# Altium footprint library IC.PCBLIB: 359 footprints (part 20 of 23)
Each footprint in its own frame and in the unit in brackets; x right, y up, seen from the top. Pads: shape width x height; smd on the part's side, far side on the other; paste and mask are expansions set on the pad; w line width, h text height; cw(c..) or ccw(c..) is an arc to the next point about the centre after c.
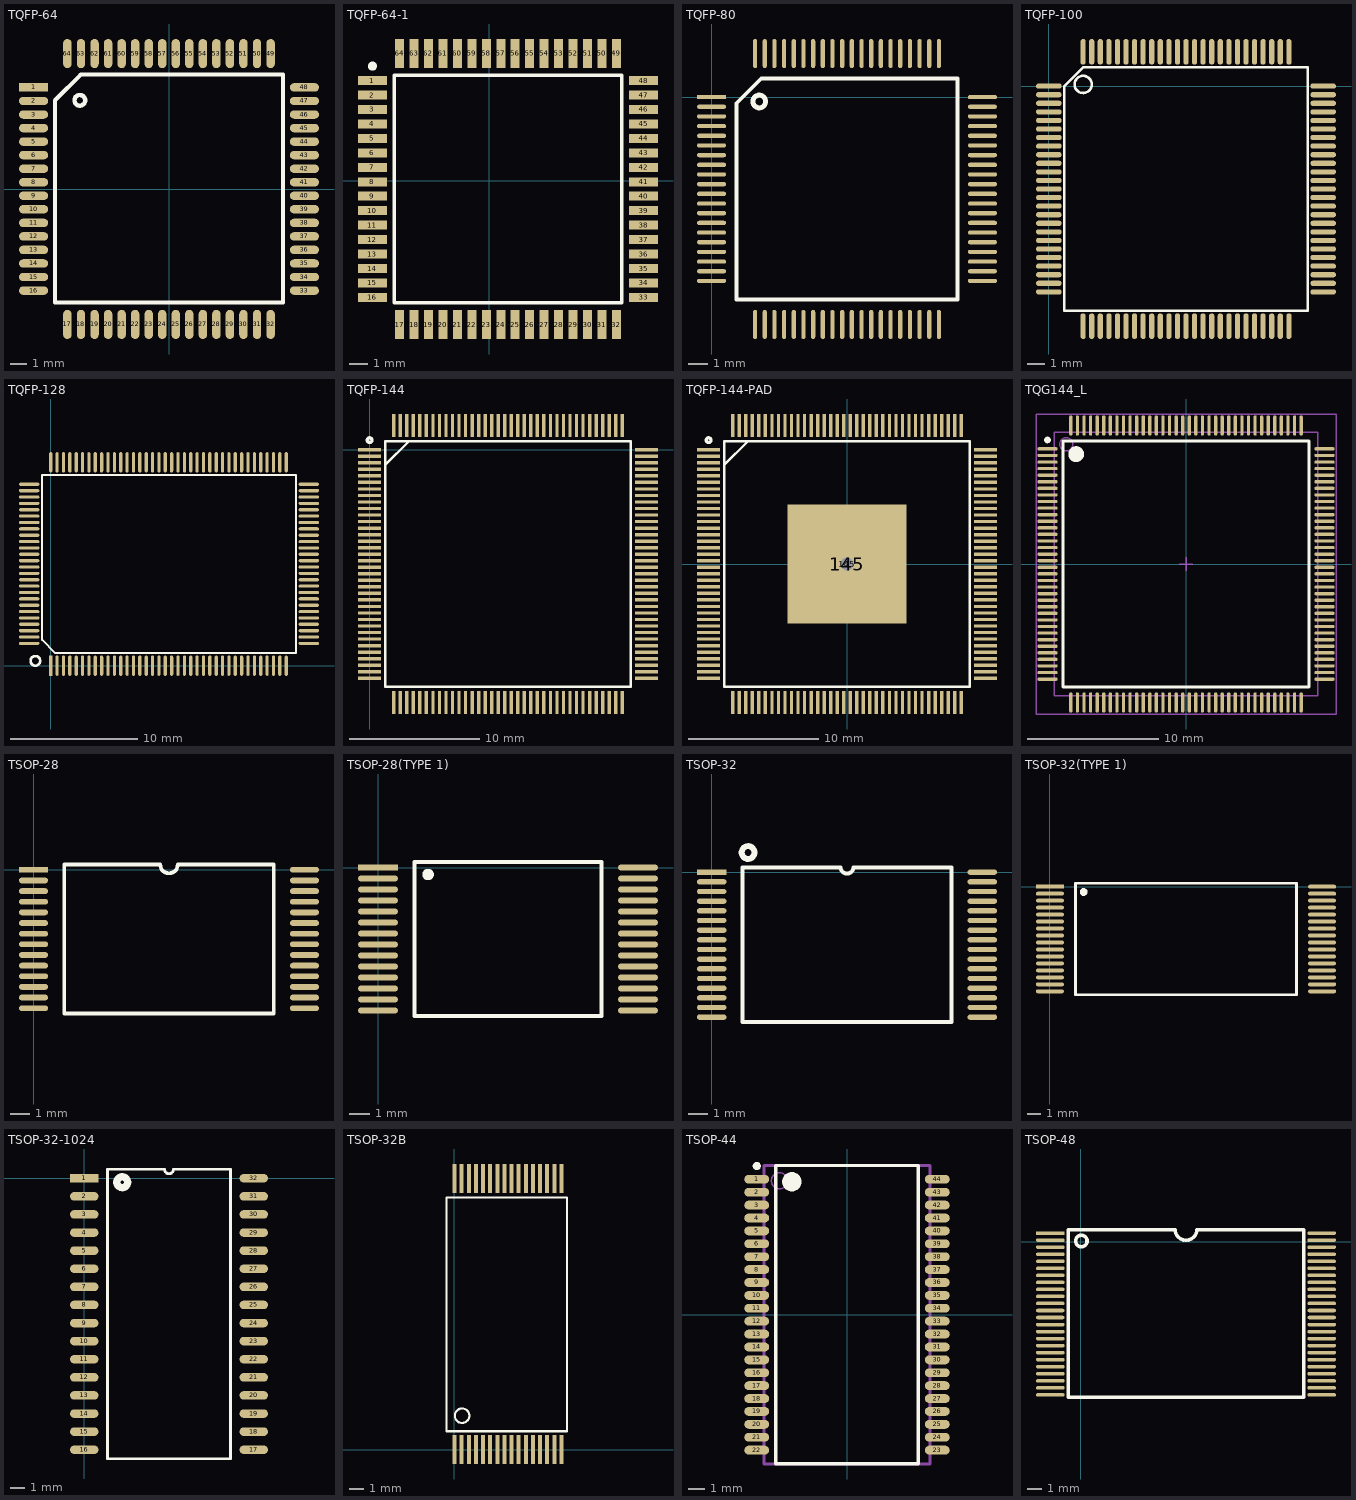
[diagram p19: the footprints below, top view; thin cyan lines are the x and y axes]

## TQFP-64 [mm]
pads (64):
  rect 1.724x0.5 smd: 1(-8,6)
  oval 1.724x0.5 smd: 2(-8,5.2) 3(-8,4.4) 4(-8,3.6) 5(-8,2.8) 6(-8,2) 7(-8,1.2) 8(-8,0.4) 9(-8,-0.4) 10(-8,-1.2) 11(-8,-2) 12(-8,-2.8) 13(-8,-3.6) 14(-8,-4.4) 15(-8,-5.2) 16(-8,-6) 33(8,-6) 34(8,-5.2) 35(8,-4.4) 36(8,-3.6) 37(8,-2.8) 38(8,-2) 39(8,-1.2) 40(8,-0.4) 41(8,0.4) 42(8,1.2) 43(8,2) 44(8,2.8) 45(8,3.6) 46(8,4.4) 47(8,5.2) 48(8,6)
  oval 0.5x1.724 smd: 17(-6,-8) 18(-5.2,-8) 19(-4.4,-8) 20(-3.6,-8) 21(-2.8,-8) 22(-2,-8) 23(-1.2,-8) 24(-0.4,-8) 25(0.4,-8) 26(1.2,-8) 27(2,-8) 28(2.8,-8) 29(3.6,-8) 30(4.4,-8) 31(5.2,-8) 32(6,-8) 49(6,8) 50(5.2,8) 51(4.4,8) 52(3.6,8) 53(2.8,8) 54(2,8) 55(1.2,8) 56(0.4,8) 57(-0.4,8) 58(-1.2,8) 59(-2,8) 60(-2.8,8) 61(-3.6,8) 62(-4.4,8) 63(-5.2,8) 64(-6,8)
TopOverlay:
  circle w0.254: c-5.268,5.238 r0.316
  lines w0.254: -6.73,-6.7 -6.73,5.238 -5.206,6.762 6.732,6.762 6.732,-6.7 -6.73,-6.7

## TQFP-64-1 [mm]
pads (64):
  rect 1.6x0.5 smd: 1(-6.459,5.543) 2(-6.459,4.743) 3(-6.459,3.943) 4(-6.459,3.143) 5(-6.459,2.343) 6(-6.459,1.543) 7(-6.459,0.743) 8(-6.459,-0.057) 9(-6.459,-0.857) 10(-6.459,-1.657) 11(-6.459,-2.457) 12(-6.459,-3.257) 13(-6.459,-4.057) 14(-6.459,-4.857) 15(-6.459,-5.657) 16(-6.459,-6.457) 33(8.541,-6.457) 34(8.541,-5.657) 35(8.541,-4.857) 36(8.541,-4.057) 37(8.541,-3.257) 38(8.541,-2.457) 39(8.541,-1.657) 40(8.541,-0.857) 41(8.541,-0.057) 42(8.541,0.743) 43(8.541,1.543) 44(8.541,2.343) 45(8.541,3.143) 46(8.541,3.943) 47(8.541,4.743) 48(8.541,5.543)
  rect 0.5x1.6 smd: 17(-4.959,-7.957) 18(-4.159,-7.957) 19(-3.359,-7.957) 20(-2.559,-7.957) 21(-1.759,-7.957) 22(-0.959,-7.957) 23(-0.159,-7.957) 24(0.641,-7.957) 25(1.441,-7.957) 26(2.241,-7.957) 27(3.041,-7.957) 28(3.841,-7.957) 29(4.641,-7.957) 30(5.441,-7.957) 31(6.241,-7.957) 32(7.041,-7.957) 49(7.041,7.043) 50(6.241,7.043) 51(5.441,7.043) 52(4.641,7.043) 53(3.841,7.043) 54(3.041,7.043) 55(2.241,7.043) 56(1.441,7.043) 57(0.641,7.043) 58(-0.159,7.043) 59(-0.959,7.043) 60(-1.759,7.043) 61(-2.559,7.043) 62(-3.359,7.043) 63(-4.159,7.043) 64(-4.959,7.043)
TopOverlay:
  circle w0.25: c-6.459,6.343 r0.125
  lines w0.2: -5.259,-6.757 -5.259,5.843 7.341,5.843 7.341,-6.757 -5.259,-6.757

## TQFP-80 [mm]
pads (80):
  rect 1.5x0.22 smd: 1(0,0)
  oval 1.5x0.22 smd: 2(0,-0.5) 3(0,-1) 4(0,-1.5) 5(0,-2) 6(0,-2.5) 7(0,-3) 8(0,-3.5) 9(0,-4) 10(0,-4.5) 11(0,-5) 12(0,-5.5) 13(0,-6) 14(0,-6.5) 15(0,-7) 16(0,-7.5) 17(0,-8) 18(0,-8.5) 19(0,-9) 20(0,-9.5) 41(14,-9.5) 42(14,-9) 43(14,-8.5) 44(14,-8) 45(14,-7.5) 46(14,-7) 47(14,-6.5) 48(14,-6) 49(14,-5.5) 50(14,-5) 51(14,-4.5) 52(14,-4) 53(14,-3.5) 54(14,-3) 55(14,-2.5) 56(14,-2) 57(14,-1.5) 58(14,-1) 59(14,-0.5) 60(14,0)
  oval 0.22x1.5 smd: 21(2.25,-11.75) 22(2.75,-11.75) 23(3.25,-11.75) 24(3.75,-11.75) 25(4.25,-11.75) 26(4.75,-11.75) 27(5.25,-11.75) 28(5.75,-11.75) 29(6.25,-11.75) 30(6.75,-11.75) 31(7.25,-11.75) 32(7.75,-11.75) 33(8.25,-11.75) 34(8.75,-11.75) 35(9.25,-11.75) 36(9.75,-11.75) 37(10.25,-11.75) 38(10.75,-11.75) 39(11.25,-11.75) 40(11.75,-11.75) 61(11.75,2.25) 62(11.25,2.25) 63(10.75,2.25) 64(10.25,2.25) 65(9.75,2.25) 66(9.25,2.25) 67(8.75,2.25) 68(8.25,2.25) 69(7.75,2.25) 70(7.25,2.25) 71(6.75,2.25) 72(6.25,2.25) 73(5.75,2.25) 74(5.25,2.25) 75(4.75,2.25) 76(4.25,2.25) 77(3.75,2.25) 78(3.25,2.25) 79(2.75,2.25) 80(2.25,2.25)
TopOverlay:
  circle w0.254: c2.465,-0.229 r0.329
  lines w0.2: 1.285,-10.465 12.715,-10.465 12.715,0.965 2.57,0.965 1.285,-0.32 1.285,-10.465

## TQFP-100 [mm]
pads (100):
  oval 1.5x0.3 smd: 1(0,0) 2(0,-0.5) 3(0,-1) 4(0,-1.5) 5(0,-2) 6(0,-2.5) 7(0,-3) 8(0,-3.5) 9(0,-4) 10(0,-4.5) 11(0,-5) 12(0,-5.5) 13(0,-6) 14(0,-6.5) 15(0,-7) 16(0,-7.5) 17(0,-8) 18(0,-8.5) 19(0,-9) 20(0,-9.5) 21(0,-10) 22(0,-10.5) 23(0,-11) 24(0,-11.5) 25(0,-12) 51(16,-12) 52(16,-11.5) 53(16,-11) 54(16,-10.5) 55(16,-10) 56(16,-9.5) 57(16,-9) 58(16,-8.5) 59(16,-8) 60(16,-7.5) 61(16,-7) 62(16,-6.5) 63(16,-6) 64(16,-5.5) 65(16,-5) 66(16,-4.5) 67(16,-4) 68(16,-3.5) 69(16,-3) 70(16,-2.5) 71(16,-2) 72(16,-1.5) 73(16,-1) 74(16,-0.5) 75(16,0)
  oval 0.3x1.5 smd: 26(2,-14) 27(2.5,-14) 28(3,-14) 29(3.5,-14) 30(4,-14) 31(4.5,-14) 32(5,-14) 33(5.5,-14) 34(6,-14) 35(6.5,-14) 36(7,-14) 37(7.5,-14) 38(8,-14) 39(8.5,-14) 40(9,-14) 41(9.5,-14) 42(10,-14) 43(10.5,-14) 44(11,-14) 45(11.5,-14) 46(12,-14) 47(12.5,-14) 48(13,-14) 49(13.5,-14) 50(14,-14) 76(14,2) 77(13.5,2) 78(13,2) 79(12.5,2) 80(12,2) 81(11.5,2) 82(11,2) 83(10.5,2) 84(10,2) 85(9.5,2) 86(9,2) 87(8.5,2) 88(8,2) 89(7.5,2) 90(7,2) 91(6.5,2) 92(6,2) 93(5.5,2) 94(5,2) 95(4.5,2) 96(4,2) 97(3.5,2) 98(3,2) 99(2.5,2) 100(2,2)
TopOverlay:
  circle w0.152: c2,0.1 r0.5
  lines w0.152: 0.9,-13.1 15.1,-13.1 15.1,1.1 2,1.1 0.9,0 0.9,-13.1

## TQFP-128 [mil]
pads (128):
  rect 10x62.99 smd: 1(0,0)
  oval 10x62.99 smd: 2(19.68,0) 3(39.37,0) 4(59.05,0) 5(78.74,0) 6(98.42,0) 7(118.11,0) 8(137.79,0) 9(157.48,0) 10(177.16,0) 11(196.85,0) 12(216.53,0) 13(236.22,0) 14(255.91,0) 15(275.59,0) 16(295.27,0) 17(314.96,0) 18(334.64,0) 19(354.33,0) 20(374.01,0) 21(393.7,0) 22(413.38,0) 23(433.07,0) 24(452.75,0) 25(472.44,0) 26(492.12,0) 27(511.81,0) 28(531.5,0) 29(551.18,0) 30(570.87,0) 31(590.55,0) 32(610.24,0) 33(629.92,0) 34(649.61,0) 35(669.29,0) 36(688.98,0) 37(708.66,0) 38(728.35,0) 65(728.35,629) 66(708.66,629) 67(688.98,629) 68(669.29,629) 69(649.61,629) 70(629.92,629) 71(610.24,629) 72(590.55,629) 73(570.87,629) 74(551.18,629) 75(531.5,629) 76(511.81,629) 77(492.12,629) 78(472.44,629) 79(452.75,629) 80(433.07,629) 81(413.38,629) 82(393.7,629) 83(374.01,629) 84(354.33,629) 85(334.64,629) 86(314.96,629) 87(295.27,629) 88(275.59,629) 89(255.91,629) 90(236.22,629) 91(216.53,629) 92(196.85,629) 93(177.16,629) 94(157.48,629) 95(137.79,629) 96(118.11,629) 97(98.42,629) 98(78.74,629) 99(59.05,629) 100(39.37,629) 101(19.68,629) 102(0,629)
  oval 62.99x10 smd: 39(798.35,68.88) 40(798.35,88.56) 41(798.35,108.25) 42(798.35,127.93) 43(798.35,147.62) 44(798.35,167.3) 45(798.35,186.99) 46(798.35,206.67) 47(798.35,226.35) 48(798.35,246.04) 49(798.35,265.73) 50(798.35,285.41) 51(798.35,305.1) 52(798.35,324.78) 53(798.35,344.46) 54(798.35,364.15) 55(798.35,383.83) 56(798.35,403.52) 57(798.35,423.2) 58(798.35,442.89) 59(798.35,462.57) 60(798.35,482.26) 61(798.35,501.94) 62(798.35,521.63) 63(798.35,541.32) 64(798.35,561) 103(-66.66,561) 104(-66.66,541.32) 105(-66.66,521.63) 106(-66.66,501.94) 107(-66.66,482.26) 108(-66.66,462.57) 109(-66.66,442.89) 110(-66.66,423.2) 111(-66.66,403.52) 112(-66.66,383.83) 113(-66.66,364.15) 114(-66.66,344.46) 115(-66.66,324.78) 116(-66.66,305.1) 117(-66.66,285.41) 118(-66.66,265.73) 119(-66.66,246.04) 120(-66.66,226.35) 121(-66.66,206.67) 122(-66.66,186.99) 123(-66.66,167.3) 124(-66.66,147.62) 125(-66.66,127.93) 126(-66.66,108.25) 127(-66.66,88.56) 128(-66.66,68.88)
TopOverlay:
  circle w8: c-47.52,14.88 r14.87
  lines w6: -26.66,79.88 14.35,38.88 759.35,38.88 759.35,589.88 -26.66,589.88 -26.66,79.88

## TQFP-144 [mil]
pads (144):
  rect 70x10 smd: 1(0,0) 2(0,-19.68) 3(0,-39.37) 4(0,-59.05) 5(0,-78.74) 6(0,-98.42) 7(0,-118.11) 8(0,-137.79) 9(0,-157.48) 10(0,-177.16) 11(0,-196.85) 12(0,-216.53) 13(0,-236.22) 14(0,-255.91) 15(0,-275.59) 16(0,-295.28) 17(0,-314.96) 18(0,-334.65) 19(0,-354.33) 20(0,-374.02) 21(0,-393.7) 22(0,-413.39) 23(0,-433.07) 24(0,-452.76) 25(0,-472.44) 26(0,-492.13) 27(0,-511.81) 28(0,-531.5) 29(0,-551.18) 30(0,-570.87) 31(0,-590.55) 32(0,-610.24) 33(0,-629.92) 34(0,-649.61) 35(0,-669.29) 36(0,-688.98) 73(834.65,-688.98) 74(834.65,-669.29) 75(834.65,-649.61) 76(834.65,-629.92) 77(834.65,-610.24) 78(834.65,-590.55) 79(834.65,-570.87) 80(834.65,-551.18) 81(834.65,-531.5) 82(834.65,-511.81) 83(834.65,-492.13) 84(834.65,-472.44) 85(834.65,-452.76) 86(834.65,-433.07) 87(834.65,-413.39) 88(834.65,-393.7) 89(834.65,-374.02) 90(834.65,-354.33) 91(834.65,-334.65) 92(834.65,-314.96) 93(834.65,-295.28) 94(834.65,-275.59) 95(834.65,-255.91) 96(834.65,-236.22) 97(834.65,-216.53) 98(834.65,-196.85) 99(834.65,-177.16) 100(834.65,-157.48) 101(834.65,-137.79) 102(834.65,-118.11) 103(834.65,-98.42) 104(834.65,-78.74) 105(834.65,-59.05) 106(834.65,-39.37) 107(834.65,-19.68) 108(834.65,0)
  rect 10x70 smd: 37(72.83,-761.81) 38(92.52,-761.81) 39(112.2,-761.81) 40(131.89,-761.81) 41(151.57,-761.81) 42(171.26,-761.81) 43(190.94,-761.81) 44(210.63,-761.81) 45(230.31,-761.81) 46(250,-761.81) 47(269.69,-761.81) 48(289.37,-761.81) 49(309.06,-761.81) 50(328.74,-761.81) 51(348.43,-761.81) 52(368.11,-761.81) 53(387.8,-761.81) 54(407.48,-761.81) 55(427.17,-761.81) 56(446.85,-761.81) 57(466.54,-761.81) 58(486.22,-761.81) 59(505.91,-761.81) 60(525.59,-761.81) 61(545.28,-761.81) 62(564.96,-761.81) 63(584.65,-761.81) 64(604.33,-761.81) 65(624.02,-761.81) 66(643.7,-761.81) 67(663.39,-761.81) 68(683.07,-761.81) 69(702.76,-761.81) 70(722.44,-761.81) 71(742.13,-761.81) 72(761.81,-761.81) 109(761.81,72.83) 110(742.13,72.83) 111(722.44,72.83) 112(702.76,72.83) 113(683.07,72.83) 114(663.39,72.83) 115(643.7,72.83) 116(624.02,72.83) 117(604.33,72.83) 118(584.65,72.83) 119(564.96,72.83) 120(545.28,72.83) 121(525.59,72.83) 122(505.91,72.83) 123(486.22,72.83) 124(466.54,72.83) 125(446.85,72.83) 126(427.17,72.83) 127(407.48,72.83) 128(387.8,72.83) 129(368.11,72.83) 130(348.43,72.83) 131(328.74,72.83) 132(309.06,72.83) 133(289.37,72.83) 134(269.69,72.83) 135(250,72.83) 136(230.31,72.83) 137(210.63,72.83) 138(190.94,72.83) 139(171.26,72.83) 140(151.57,72.83) 141(131.89,72.83) 142(112.2,72.83) 143(92.52,72.83) 144(72.83,72.83)
TopOverlay:
  circle w9.84: c-0.02,29 r7.02
  lines w7.8: 47.41,-45 118,25.59
  lines w7.87: 47.24,-714.57 47.24,25.59 787.4,25.59 787.4,-714.57 47.24,-714.57

## TQFP-144-PAD [mil]
height 50
pads (146):
  rect 70x10 smd: 1(-417.32,344.49) 2(-417.32,324.8) 3(-417.32,305.12) 4(-417.32,285.43) 5(-417.32,265.75) 6(-417.32,246.06) 7(-417.32,226.38) 8(-417.32,206.69) 9(-417.32,187.01) 10(-417.32,167.32) 11(-417.32,147.64) 12(-417.32,127.95) 13(-417.32,108.27) 14(-417.32,88.58) 15(-417.32,68.9) 16(-417.32,49.21) 17(-417.32,29.53) 18(-417.32,9.84) 19(-417.32,-9.84) 20(-417.32,-29.53) 21(-417.32,-49.21) 22(-417.32,-68.9) 23(-417.32,-88.58) 24(-417.32,-108.27) 25(-417.32,-127.95) 26(-417.32,-147.64) 27(-417.32,-167.32) 28(-417.32,-187.01) 29(-417.32,-206.69) 30(-417.32,-226.38) 31(-417.32,-246.06) 32(-417.32,-265.75) 33(-417.32,-285.43) 34(-417.32,-305.12) 35(-417.32,-324.8) 36(-417.32,-344.49) 73(417.32,-344.49) 74(417.32,-324.8) 75(417.32,-305.12) 76(417.32,-285.43) 77(417.32,-265.75) 78(417.32,-246.06) 79(417.32,-226.38) 80(417.32,-206.69) 81(417.32,-187.01) 82(417.32,-167.32) 83(417.32,-147.64) 84(417.32,-127.95) 85(417.32,-108.27) 86(417.32,-88.58) 87(417.32,-68.9) 88(417.32,-49.21) 89(417.32,-29.53) 90(417.32,-9.84) 91(417.32,9.84) 92(417.32,29.53) 93(417.32,49.21) 94(417.32,68.9) 95(417.32,88.58) 96(417.32,108.27) 97(417.32,127.95) 98(417.32,147.64) 99(417.32,167.32) 100(417.32,187.01) 101(417.32,206.69) 102(417.32,226.38) 103(417.32,246.06) 104(417.32,265.75) 105(417.32,285.43) 106(417.32,305.12) 107(417.32,324.8) 108(417.32,344.49)
  rect 10x70 smd: 37(-344.49,-417.32) 38(-324.8,-417.32) 39(-305.12,-417.32) 40(-285.43,-417.32) 41(-265.75,-417.32) 42(-246.06,-417.32) 43(-226.38,-417.32) 44(-206.69,-417.32) 45(-187.01,-417.32) 46(-167.32,-417.32) 47(-147.64,-417.32) 48(-127.95,-417.32) 49(-108.27,-417.32) 50(-88.58,-417.32) 51(-68.9,-417.32) 52(-49.21,-417.32) 53(-29.53,-417.32) 54(-9.84,-417.32) 55(9.84,-417.32) 56(29.53,-417.32) 57(49.21,-417.32) 58(68.9,-417.32) 59(88.58,-417.32) 60(108.27,-417.32) 61(127.95,-417.32) 62(147.64,-417.32) 63(167.32,-417.32) 64(187.01,-417.32) 65(206.69,-417.32) 66(226.38,-417.32) 67(246.06,-417.32) 68(265.75,-417.32) 69(285.43,-417.32) 70(305.12,-417.32) 71(324.8,-417.32) 72(344.49,-417.32) 109(344.49,417.32) 110(324.8,417.32) 111(305.12,417.32) 112(285.43,417.32) 113(265.75,417.32) 114(246.06,417.32) 115(226.38,417.32) 116(206.69,417.32) 117(187.01,417.32) 118(167.32,417.32) 119(147.64,417.32) 120(127.95,417.32) 121(108.27,417.32) 122(88.58,417.32) 123(68.9,417.32) 124(49.21,417.32) 125(29.53,417.32) 126(9.84,417.32) 127(-9.84,417.32) 128(-29.53,417.32) 129(-49.21,417.32) 130(-68.9,417.32) 131(-88.58,417.32) 132(-108.27,417.32) 133(-127.95,417.32) 134(-147.64,417.32) 135(-167.32,417.32) 136(-187.01,417.32) 137(-206.69,417.32) 138(-226.38,417.32) 139(-246.06,417.32) 140(-265.75,417.32) 141(-285.43,417.32) 142(-305.12,417.32) 143(-324.8,417.32) 144(-344.49,417.32)
  rect 360x360 smd: 145(0,0)
  oct 62x62 hole 40: 145(0,0)
TopOverlay:
  circle w9.84: c-417.35,373.49 r7.02
  lines w7.8: -369.91,299.49 -299.32,370.08
  lines w7.87: -370.08,-370.08 370.08,-370.08 370.08,370.08 -370.08,370.08 -370.08,-370.08
TopSolder:
  region: 30,180 30,30 180,30 180,180
  region: 180,-30 30,-30 30,-180 180,-180
  region: -30,-180 -30,-30 -180,-30 -180,-180
  rectangle: -180,30 -30,180

## TQG144_L [mm] "Thin QFP, 144-Leads, Body 20x20mm, Pitch 0.5mm, IPC High Density"
height 1.6
pads (144):
  oval 1.55x0.25 smd: 1(-10.525,8.75) 2(-10.525,8.25) 3(-10.525,7.75) 4(-10.525,7.25) 5(-10.525,6.75) 6(-10.525,6.25) 7(-10.525,5.75) 8(-10.525,5.25) 9(-10.525,4.75) 10(-10.525,4.25) 11(-10.525,3.75) 12(-10.525,3.25) 13(-10.525,2.75) 14(-10.525,2.25) 15(-10.525,1.75) 16(-10.525,1.25) 17(-10.525,0.75) 18(-10.525,0.25) 19(-10.525,-0.25) 20(-10.525,-0.75) 21(-10.525,-1.25) 22(-10.525,-1.75) 23(-10.525,-2.25) 24(-10.525,-2.75) 25(-10.525,-3.25) 26(-10.525,-3.75) 27(-10.525,-4.25) 28(-10.525,-4.75) 29(-10.525,-5.25) 30(-10.525,-5.75) 31(-10.525,-6.25) 32(-10.525,-6.75) 33(-10.525,-7.25) 34(-10.525,-7.75) 35(-10.525,-8.25) 36(-10.525,-8.75) 73(10.525,-8.75) 74(10.525,-8.25) 75(10.525,-7.75) 76(10.525,-7.25) 77(10.525,-6.75) 78(10.525,-6.25) 79(10.525,-5.75) 80(10.525,-5.25) 81(10.525,-4.75) 82(10.525,-4.25) 83(10.525,-3.75) 84(10.525,-3.25) 85(10.525,-2.75) 86(10.525,-2.25) 87(10.525,-1.75) 88(10.525,-1.25) 89(10.525,-0.75) 90(10.525,-0.25) 91(10.525,0.25) 92(10.525,0.75) 93(10.525,1.25) 94(10.525,1.75) 95(10.525,2.25) 96(10.525,2.75) 97(10.525,3.25) 98(10.525,3.75) 99(10.525,4.25) 100(10.525,4.75) 101(10.525,5.25) 102(10.525,5.75) 103(10.525,6.25) 104(10.525,6.75) 105(10.525,7.25) 106(10.525,7.75) 107(10.525,8.25) 108(10.525,8.75)
  oval 0.25x1.55 smd: 37(-8.75,-10.525) 38(-8.25,-10.525) 39(-7.75,-10.525) 40(-7.25,-10.525) 41(-6.75,-10.525) 42(-6.25,-10.525) 43(-5.75,-10.525) 44(-5.25,-10.525) 45(-4.75,-10.525) 46(-4.25,-10.525) 47(-3.75,-10.525) 48(-3.25,-10.525) 49(-2.75,-10.525) 50(-2.25,-10.525) 51(-1.75,-10.525) 52(-1.25,-10.525) 53(-0.75,-10.525) 54(-0.25,-10.525) 55(0.25,-10.525) 56(0.75,-10.525) 57(1.25,-10.525) 58(1.75,-10.525) 59(2.25,-10.525) 60(2.75,-10.525) 61(3.25,-10.525) 62(3.75,-10.525) 63(4.25,-10.525) 64(4.75,-10.525) 65(5.25,-10.525) 66(5.75,-10.525) 67(6.25,-10.525) 68(6.75,-10.525) 69(7.25,-10.525) 70(7.75,-10.525) 71(8.25,-10.525) 72(8.75,-10.525) 109(8.75,10.525) 110(8.25,10.525) 111(7.75,10.525) 112(7.25,10.525) 113(6.75,10.525) 114(6.25,10.525) 115(5.75,10.525) 116(5.25,10.525) 117(4.75,10.525) 118(4.25,10.525) 119(3.75,10.525) 120(3.25,10.525) 121(2.75,10.525) 122(2.25,10.525) 123(1.75,10.525) 124(1.25,10.525) 125(0.75,10.525) 126(0.25,10.525) 127(-0.25,10.525) 128(-0.75,10.525) 129(-1.25,10.525) 130(-1.75,10.525) 131(-2.25,10.525) 132(-2.75,10.525) 133(-3.25,10.525) 134(-3.75,10.525) 135(-4.25,10.525) 136(-4.75,10.525) 137(-5.25,10.525) 138(-5.75,10.525) 139(-6.25,10.525) 140(-6.75,10.525) 141(-7.25,10.525) 142(-7.75,10.525) 143(-8.25,10.525) 144(-8.75,10.525)
TopOverlay:
  circle w0.25: c-10.525,9.425 r0.125
  circle w0.6: c-8.35,8.35 r0.3
  lines w0.2: -9.35,-9.35 -9.35,9.35 9.35,9.35 9.35,-9.35 -9.35,-9.35
Mechanical13:
  circle w0.1: c-9.1,9.1 r0.5
  lines w0.1: -10,-10 -10,10 10,10 10,-10 -10,-10
Mechanical15:
  lines w0.1: -0.5,0 0.5,0 ; 0,-0.5 0,0.5 ; -11.4,-11.4 -11.4,11.4 11.4,11.4 11.4,-11.4 -11.4,-11.4
3D body: height 1.6, standoff 0, extent -10,-10 10,10

## TSOP-28 [mm]
pads (28):
  rect 1.5x0.3 smd: 1(0,0)
  oval 1.5x0.3 smd: 2(0,-0.55) 3(0,-1.1) 4(0,-1.65) 5(0,-2.2) 6(0,-2.75) 7(0,-3.3) 8(0,-3.85) 9(0,-4.4) 10(0,-4.95) 11(0,-5.5) 12(0,-6.05) 13(0,-6.6) 14(0,-7.15) 15(14,-7.15) 16(14,-6.6) 17(14,-6.05) 18(14,-5.5) 19(14,-4.95) 20(14,-4.4) 21(14,-3.85) 22(14,-3.3) 23(14,-2.75) 24(14,-2.2) 25(14,-1.65) 26(14,-1.1) 27(14,-0.55) 28(14,0)
TopOverlay:
  lines w0.2: 1.585,-7.425 1.585,0.275 6.547,0.275 ccw(c7,0.275) 7.453,0.275 12.415,0.275 12.415,-7.425 1.585,-7.425

## TSOP-28(TYPE 1) [mm]
pads (28):
  rect 2x0.28 smd: 1(0,0)
  oval 2x0.28 smd: 2(0,-0.55) 3(0,-1.1) 4(0,-1.65) 5(0,-2.2) 6(0,-2.75) 7(0,-3.3) 8(0,-3.85) 9(0,-4.4) 10(0,-4.95) 11(0,-5.5) 12(0,-6.05) 13(0,-6.6) 14(0,-7.15) 15(13,-7.15) 16(13,-6.6) 17(13,-6.05) 18(13,-5.5) 19(13,-4.95) 20(13,-4.4) 21(13,-3.85) 22(13,-3.3) 23(13,-2.75) 24(13,-2.2) 25(13,-1.65) 26(13,-1.1) 27(13,-0.55) 28(13,0)
TopOverlay:
  circle w0.3: c2.503,-0.35 r0.137
  lines w0.2: 1.835,-7.425 11.165,-7.425 11.165,0.275 1.835,0.275 1.835,-7.425

## TSOP-32 [mil]
pads (32):
  rect 60x11 smd: 1(0,0)
  oval 60x11 smd: 2(0,-19.68) 3(0,-39.37) 4(0,-59.05) 5(0,-78.74) 6(0,-98.42) 7(0,-118.11) 8(0,-137.79) 9(0,-157.48) 10(0,-177.16) 11(0,-196.85) 12(0,-216.53) 13(0,-236.22) 14(0,-255.91) 15(0,-275.59) 16(0,-295.27) 17(551.18,-295.27) 18(551.18,-275.59) 19(551.18,-255.91) 20(551.18,-236.22) 21(551.18,-216.53) 22(551.18,-196.85) 23(551.18,-177.16) 24(551.18,-157.48) 25(551.18,-137.79) 26(551.18,-118.11) 27(551.18,-98.42) 28(551.18,-78.74) 29(551.18,-59.05) 30(551.18,-39.37) 31(551.18,-19.68) 32(551.18,0)
TopOverlay:
  circle w12: c74,40 r13
  lines w7.87: 62.4,-305.12 62.4,9.84 262.73,9.84 ccw(c275.59,9.84) 288.45,9.84 488.78,9.84 488.78,-305.12 62.4,-305.12

## TSOP-32(TYPE 1) [mm]
pads (32):
  rect 2x0.28 smd: 1(0,0)
  oval 2x0.28 smd: 2(0,-0.5) 3(0,-1) 4(0,-1.5) 5(0,-2) 6(0,-2.5) 7(0,-3) 8(0,-3.5) 9(0,-4) 10(0,-4.5) 11(0,-5) 12(0,-5.5) 13(0,-6) 14(0,-6.5) 15(0,-7) 16(0,-7.5) 17(19.5,-7.5) 18(19.5,-7) 19(19.5,-6.5) 20(19.5,-6) 21(19.5,-5.5) 22(19.5,-5) 23(19.5,-4.5) 24(19.5,-4) 25(19.5,-3.5) 26(19.5,-3) 27(19.5,-2.5) 28(19.5,-2) 29(19.5,-1.5) 30(19.5,-1) 31(19.5,-0.5) 32(19.5,0)
TopOverlay:
  circle w0.3: c2.415,-0.381 r0.125
  lines w0.2: 1.835,-7.75 1.835,0.25 17.665,0.25 17.665,-7.75 1.835,-7.75

## TSOP-32-1024 [mm]
pads (32):
  rect 2x0.6 smd: 1(0,0)
  oval 2x0.6 smd: 2(0,-1.27) 3(0,-2.54) 4(0,-3.81) 5(0,-5.08) 6(0,-6.35) 7(0,-7.62) 8(0,-8.89) 9(0,-10.16) 10(0,-11.43) 11(0,-12.7) 12(0,-13.97) 13(0,-15.24) 14(0,-16.51) 15(0,-17.78) 16(0,-19.05) 17(11.9,-19.05) 18(11.9,-17.78) 19(11.9,-16.51) 20(11.9,-15.24) 21(11.9,-13.97) 22(11.9,-12.7) 23(11.9,-11.43) 24(11.9,-10.16) 25(11.9,-8.89) 26(11.9,-7.62) 27(11.9,-6.35) 28(11.9,-5.08) 29(11.9,-3.81) 30(11.9,-2.54) 31(11.9,-1.27) 32(11.9,0)
TopOverlay:
  circle w0.508: c2.667,-0.279 r0.381
  lines w0.2: 1.635,-19.685 1.635,0.635 5.632,0.635 ccw(c5.95,0.635) 6.267,0.635 10.265,0.635 10.265,-19.685 1.635,-19.685

## TSOP-32B [mm]
pads (32):
  rect 0.28x2.032 smd: 1(0,0) 2(0.5,0) 3(1,0) 4(1.5,0) 5(2,0) 6(2.5,0) 7(3,0) 8(3.5,0) 9(4,0) 10(4.5,0) 11(5,0) 12(5.5,0) 13(6,0) 14(6.5,0) 15(7,0) 16(7.5,0) 17(7.5,18.994) 18(7,18.994) 19(6.5,18.994) 20(6,18.994) 21(5.5,18.994) 22(5,18.994) 23(4.5,18.994) 24(4,18.994) 25(3.5,18.994) 26(3,18.994) 27(2.5,18.994) 28(2,18.994) 29(1.5,18.994) 30(1,18.994) 31(0.5,18.994) 32(0,18.994)
TopOverlay:
  circle w0.152: c0.533,2.368 r0.508
  lines w0.152: -0.566,1.276 7.895,1.276 7.895,17.659 -0.566,17.659 -0.566,1.276

## TSOP-44 [mm]
height 1.6
pads (44):
  oval 1.55x0.55 smd: 1(-5.6,8.4) 2(-5.6,7.6) 3(-5.6,6.8) 4(-5.6,6) 5(-5.6,5.2) 6(-5.6,4.4) 7(-5.6,3.6) 8(-5.6,2.8) 9(-5.6,2) 10(-5.6,1.2) 11(-5.6,0.4) 12(-5.6,-0.4) 13(-5.6,-1.2) 14(-5.6,-2) 15(-5.6,-2.8) 16(-5.6,-3.6) 17(-5.6,-4.4) 18(-5.6,-5.2) 19(-5.6,-6) 20(-5.6,-6.8) 21(-5.6,-7.6) 22(-5.6,-8.4) 23(5.6,-8.4) 24(5.6,-7.6) 25(5.6,-6.8) 26(5.6,-6) 27(5.6,-5.2) 28(5.6,-4.4) 29(5.6,-3.6) 30(5.6,-2.8) 31(5.6,-2) 32(5.6,-1.2) 33(5.6,-0.4) 34(5.6,0.4) 35(5.6,1.2) 36(5.6,2) 37(5.6,2.8) 38(5.6,3.6) 39(5.6,4.4) 40(5.6,5.2) 41(5.6,6) 42(5.6,6.8) 43(5.6,7.6) 44(5.6,8.4)
TopOverlay:
  circle w0.25: c-5.6,9.225 r0.125
  circle w0.6: c-3.425,8.25 r0.3
  lines w0.2: -4.425,-9.25 -4.425,9.25 4.425,9.25 4.425,-9.25 -4.425,-9.25
Mechanical13:
  circle w0.1: c-4.195,8.31 r0.5
  lines w0.2: -5.145,-9.26 -5.145,9.26 5.145,9.26 5.145,-9.26 -5.145,-9.26

## TSOP-48 [mil]
pads (48):
  rect 80x10 smd: 1(-85,24)
  oval 80x10 smd: 2(-85,4.32) 3(-85,-15.37) 4(-85,-35.05) 5(-85,-54.74) 6(-85,-74.42) 7(-85,-94.11) 8(-85,-113.8) 9(-85,-133.48) 10(-85,-153.16) 11(-85,-172.85) 12(-85,-192.53) 13(-85,-212.22) 14(-85,-231.91) 15(-85,-251.59) 16(-85,-271.27) 17(-85,-290.96) 18(-85,-310.64) 19(-85,-330.33) 20(-85,-350.01) 21(-85,-369.7) 22(-85,-389.38) 23(-85,-409.07) 24(-85,-428.75) 25(675,-428.75) 26(675,-409.07) 27(675,-389.38) 28(675,-369.7) 29(675,-350.01) 30(675,-330.33) 31(675,-310.64) 32(675,-290.96) 33(675,-271.27) 34(675,-251.59) 35(675,-231.91) 36(675,-212.22) 37(675,-192.53) 38(675,-172.85) 39(675,-153.16) 40(675,-133.48) 41(675,-113.8) 42(675,-94.11) 43(675,-74.42) 44(675,-54.74) 45(675,-35.05) 46(675,-15.37) 47(675,4.32) 48(675,24)
TopOverlay:
  circle w10: c1.88,2 r16.12
  lines w10: -35,-436 -35,34 264.99,34 ccw(c294.99,34) 324.99,34 625,34 625,-436 -35,-436